# Altium schematic symbol library IC_ADI.SCHLIB: 3169 symbols (part 2 of 181) (continued)
## AD664AJ
designator U?
Quad 12-Bit Monolithic Digital-to-Analog Converter, -40 to +85 degC, J-44, Pb-Free, Tube; Generic Part Number: AD664; PartNumber: AD664AJ; # DAC Outputs: 4; Max V+: 16.5V; Op Pwr Diss: 525mW; Resolution (Bits): 12; Settling Time: 8祍; Single Supply: No; DatasheetVersion: Rev.D; PackageVersion: rev0, 1992; PackageReference: J-44; PackageDescription: 44-Pin Leaded Chip Carrier 1.27 mm Pitch; Supplier Part Number 1: AD664AJ-ND; Supplier Part Number 2: 584-AD664AJ; Packing: Tube; RoHS: Y; Mounting Technology: Surface Mount; ComponentLink1Description: Manufacturer URL; ComponentLink2Description: Datasheet; ComponentLink3Description: Package Specification; ComponentLink4Description: Product URL
footprint PLCC-44N (Footprint not found)
pins: 1 ~{RD} (in), 2 ~{LS} (in), 3 NO CONNECT, 4 AGND (power), 5 VCC (+12V/+15V) (power), 6 VEE (-12V/-15V) (power), 7 RFA (in), 8 VOA (hiz), 9 VOB (hiz), 10 RFB (in), 11 VREFIN (in), 12 RFC (in), 13 VOC (hiz), 14 VOD (hiz), 15 RFD (in), 16 NO CONNECT, 17 NO CONNECT, 18 ~{CS} (in), 19 DS0 (in), 20 DS1 (in), 21 DGND (power), 22 ~{RST} (in), 23 ~{QS0} (in), 24 ~{QS1} (in), 25 ~{QS2} (in), 26 ~{TR} (in), 27 ~{MS} (in), 28 (LSB) DB0 (io), 29 DB1 (io), 30 DB2 (io), 31 DB3 (io), 32 DB4 (io), 33 DB5 (io), 34 NO CONNECT, 35 DB6 (io), 36 DB7 (io), 37 DB8 (io), 38 DB9 (io), 39 DB10 (io), 40 DB11 (MSB) (io), 41 NO CONNECT, 42 VLL (+5V) (power), 43 NO CONNECT, 44 NO CONNECT

## AD664BD-BIP
designator U?
Quad 12-Bit Monolithic Digital-to-Analog Converter, -40 to +85 degC, D-28-2, Tube; Generic Part Number: AD664; PartNumber: AD664BD-BIP; # DAC Outputs: 4; Max V+: 16.5V; Op Pwr Diss: 525mW; Resolution (Bits): 12; Settling Time: 8祍; Single Supply: No; DatasheetVersion: Rev.D; PackageVersion: Oct-2004; PackageReference: D-28-2; PackageDescription: 28-Lead Side-Brazed Ceramic Dual In-Line Package [SBDIP]; Supplier Part Number 1: AD664BD-BIP-ND; Supplier Part Number 2: 05F7168; Supplier Part Number 3: 584-AD664BD-BIP; Packing: Tube; RoHS: N; Mounting Technology: Through Hole; ComponentLink1Description: Manufacturer URL; ComponentLink2Description: Datasheet; ComponentLink3Description: Package Specification; ComponentLink4Description: Product URL
footprint DIP28W (Footprint not found)
pins: 1 VREFIN (in), 2 VOC (hiz), 3 VOD (hiz), 4 ~{CS} (in), 5 DS0 (in), 6 DS1 (in), 7 DGND (power), 8 ~{RST} (in), 9 DB0 (LSB) (io), 10 DB1 (io), 11 DB2 (io), 12 DB3 (io), 13 DB4 (io), 14 DB5 (io), 15 DB6 (io), 16 DB7 (io), 17 DB8 (io), 18 DB9 (io), 19 DB10 (io), 20 DB11 (MSB) (io), 21 VLL (+5V) (power), 22 ~{RD} (in), 23 ~{LS} (in), 24 AGND (power), 25 VCC (+12V/+15V) (power), 26 VEE(-12V/-15V) (power), 27 VOA (hiz), 28 VOB (hiz)

## AD664BD-UNI
designator U?
Quad 12-Bit Monolithic Digital-to-Analog Converter, -40 to +85 degC, D-28-2, Tube; Generic Part Number: AD664; PartNumber: AD664BD-UNI; # DAC Outputs: 4; Max V+: 16.5V; Op Pwr Diss: 525mW; Resolution (Bits): 12; Settling Time: 8祍; Single Supply: No; DatasheetVersion: Rev.D; PackageVersion: Oct-2004; PackageReference: D-28-2; PackageDescription: 28-Lead Side-Brazed Ceramic Dual In-Line Package [SBDIP]; Supplier Part Number 1: AD664BD-UNI-ND; Supplier Part Number 2: 05F7169; Supplier Part Number 3: 584-AD664BD-UNI; Packing: Tube; RoHS: N; Mounting Technology: Through Hole; ComponentLink1Description: Manufacturer URL; ComponentLink2Description: Datasheet; ComponentLink3Description: Package Specification; ComponentLink4Description: Product URL
footprint DIP28W (Footprint not found)
pins: 1 VREFIN (in), 2 VOC (hiz), 3 VOD (hiz), 4 ~{CS} (in), 5 DS0 (in), 6 DS1 (in), 7 DGND (power), 8 ~{RST} (in), 9 DB0 (LSB) (io), 10 DB1 (io), 11 DB2 (io), 12 DB3 (io), 13 DB4 (io), 14 DB5 (io), 15 DB6 (io), 16 DB7 (io), 17 DB8 (io), 18 DB9 (io), 19 DB10 (io), 20 DB11 (MSB) (io), 21 VLL (+5V) (power), 22 ~{RD} (in), 23 ~{LS} (in), 24 AGND (power), 25 VCC (+12V/+15V) (power), 26 VEE(-12V/-15V) (power), 27 VOA (hiz), 28 VOB (hiz)

## AD664BE
designator U?
Quad 12-Bit Monolithic Digital-to-Analog Converter, -40 to +85 degC, E-44-1, Pb-Free, Tube; Generic Part Number: AD664; PartNumber: AD664BE; # DAC Outputs: 4; Max V+: 16.5V; Op Pwr Diss: 525mW; Resolution (Bits): 12; Settling Time: 8祍; Single Supply: No; DatasheetVersion: Rev.D; PackageVersion: 022106-A; PackageReference: E-44-1; PackageDescription: 44-Terminal Ceramic Leadless Chip Carrier [LCC]; Supplier Part Number 1: AD664BE-ND; Supplier Part Number 2: 584-AD664BE; Packing: Tube; RoHS: Y; Mounting Technology: Surface Mount; ComponentLink1Description: Manufacturer URL; ComponentLink2Description: Datasheet; ComponentLink3Description: Package Specification; ComponentLink4Description: Product URL
footprint PLCC-44N (Footprint not found)
pins: 1 ~{RD} (in), 2 ~{LS} (in), 3 NO CONNECT, 4 AGND (power), 5 VCC (+12V/+15V) (power), 6 VEE (-12V/-15V) (power), 7 RFA (in), 8 VOA (hiz), 9 VOB (hiz), 10 RFB (in), 11 VREFIN (in), 12 RFC (in), 13 VOC (hiz), 14 VOD (hiz), 15 RFD (in), 16 NO CONNECT, 17 NO CONNECT, 18 ~{CS} (in), 19 DS0 (in), 20 DS1 (in), 21 DGND (power), 22 ~{RST} (in), 23 ~{QS0} (in), 24 ~{QS1} (in), 25 ~{QS2} (in), 26 ~{TR} (in), 27 ~{MS} (in), 28 (LSB) DB0 (io), 29 DB1 (io), 30 DB2 (io), 31 DB3 (io), 32 DB4 (io), 33 DB5 (io), 34 NO CONNECT, 35 DB6 (io), 36 DB7 (io), 37 DB8 (io), 38 DB9 (io), 39 DB10 (io), 40 DB11 (MSB) (io), 41 NO CONNECT, 42 VLL (+5V) (power), 43 NO CONNECT, 44 NO CONNECT

## AD664BJ
designator U?
Quad 12-Bit Monolithic Digital-to-Analog Converter, -40 to +85 degC, J-44, Pb-Free, Tube; Generic Part Number: AD664; PartNumber: AD664BJ; # DAC Outputs: 4; Max V+: 16.5V; Op Pwr Diss: 525mW; Resolution (Bits): 12; Settling Time: 8祍; Single Supply: No; DatasheetVersion: Rev.D; PackageVersion: rev0, 1992; PackageReference: J-44; PackageDescription: 44-Pin Leaded Chip Carrier 1.27 mm Pitch; Supplier Part Number 1: AD664BJ-ND; Packing: Tube; RoHS: Y; Mounting Technology: Surface Mount; ComponentLink1Description: Manufacturer URL; ComponentLink2Description: Datasheet; ComponentLink3Description: Package Specification; ComponentLink4Description: Product URL
footprint PLCC-44N (Footprint not found)
pins: 1 ~{RD} (in), 2 ~{LS} (in), 3 NO CONNECT, 4 AGND (power), 5 VCC (+12V/+15V) (power), 6 VEE (-12V/-15V) (power), 7 RFA (in), 8 VOA (hiz), 9 VOB (hiz), 10 RFB (in), 11 VREFIN (in), 12 RFC (in), 13 VOC (hiz), 14 VOD (hiz), 15 RFD (in), 16 NO CONNECT, 17 NO CONNECT, 18 ~{CS} (in), 19 DS0 (in), 20 DS1 (in), 21 DGND (power), 22 ~{RST} (in), 23 ~{QS0} (in), 24 ~{QS1} (in), 25 ~{QS2} (in), 26 ~{TR} (in), 27 ~{MS} (in), 28 (LSB) DB0 (io), 29 DB1 (io), 30 DB2 (io), 31 DB3 (io), 32 DB4 (io), 33 DB5 (io), 34 NO CONNECT, 35 DB6 (io), 36 DB7 (io), 37 DB8 (io), 38 DB9 (io), 39 DB10 (io), 40 DB11 (MSB) (io), 41 NO CONNECT, 42 VLL (+5V) (power), 43 NO CONNECT, 44 NO CONNECT

## AD664JN-BIP
designator U?
Quad 12-Bit Monolithic Digital-to-Analog Converter, 0 to +70 degC, N-28-2, Tube; Generic Part Number: AD664; PartNumber: AD664JN-BIP; # DAC Outputs: 4; Max V+: 16.5V; Op Pwr Diss: 525mW; Resolution (Bits): 12; Settling Time: 8祍; Single Supply: No; DatasheetVersion: Rev.D; PackageVersion: 071006-A; PackageReference: N-28-2; PackageDescription: 28-Lead Plastic Dual In-Line Package [PDIP]; Supplier Part Number 1: AD664JN-BIP-ND; Supplier Part Number 2: 92F8921; Supplier Part Number 3: 584-AD664JN-BIP; Packing: Tube; RoHS: N; Mounting Technology: Through Hole; Code_JEDEC: MS-011; ComponentLink1Description: Manufacturer URL; ComponentLink2Description: Datasheet; ComponentLink3Description: Package Specification; ComponentLink4Description: Product URL
footprint DIP28W
pins: 1 VREF IN (in), 2 VOC (hiz), 3 VOD (hiz), 4 ~{CS} (in), 5 DS0 (in), 6 DS1 (in), 7 DGND (power), 8 ~{RST} (in), 9 DB0 (LSB) (io), 10 DB1 (io), 11 DB2 (io), 12 DB3 (io), 13 DB4 (io), 14 DB5 (io), 15 DB6 (io), 16 DB7 (io), 17 DB8 (io), 18 DB9 (io), 19 DB10 (io), 20 DB11 (MSB) (io), 21 VLL (+5V) (power), 22 ~{RD} (in), 23 ~{LS} (in), 24 AGND (power), 25 VCC (+12V/+15V) (power), 26 VEE (-12V/-15V) (power), 27 VOA (hiz), 28 VOB (hiz)

## AD664JN-UNI
designator U?
Quad 12-Bit Monolithic Digital-to-Analog Converter, 0 to +70 degC, N-28-2, Tube; Generic Part Number: AD664; PartNumber: AD664JN-UNI; # DAC Outputs: 4; Max V+: 16.5V; Op Pwr Diss: 525mW; Resolution (Bits): 12; Settling Time: 8祍; Single Supply: No; DatasheetVersion: Rev.D; PackageVersion: 071006-A; PackageReference: N-28-2; PackageDescription: 28-Lead Plastic Dual In-Line Package [PDIP]; Supplier Part Number 1: AD664JN-UNI-ND; Supplier Part Number 2: 92F8924; Supplier Part Number 3: 584-AD664JN-UNI; Packing: Tube; RoHS: N; Mounting Technology: Through Hole; Code_JEDEC: MS-011; ComponentLink1Description: Manufacturer URL; ComponentLink2Description: Datasheet; ComponentLink3Description: Package Specification; ComponentLink4Description: Product URL
footprint DIP28W
pins: 1 VREF IN (in), 2 VOC (hiz), 3 VOD (hiz), 4 ~{CS} (in), 5 DS0 (in), 6 DS1 (in), 7 DGND (power), 8 ~{RST} (in), 9 DB0 (LSB) (io), 10 DB1 (io), 11 DB2 (io), 12 DB3 (io), 13 DB4 (io), 14 DB5 (io), 15 DB6 (io), 16 DB7 (io), 17 DB8 (io), 18 DB9 (io), 19 DB10 (io), 20 DB11 (MSB) (io), 21 VLL (+5V) (power), 22 ~{RD} (in), 23 ~{LS} (in), 24 AGND (power), 25 VCC (+12V/+15V) (power), 26 VEE (-12V/-15V) (power), 27 VOA (hiz), 28 VOB (hiz)

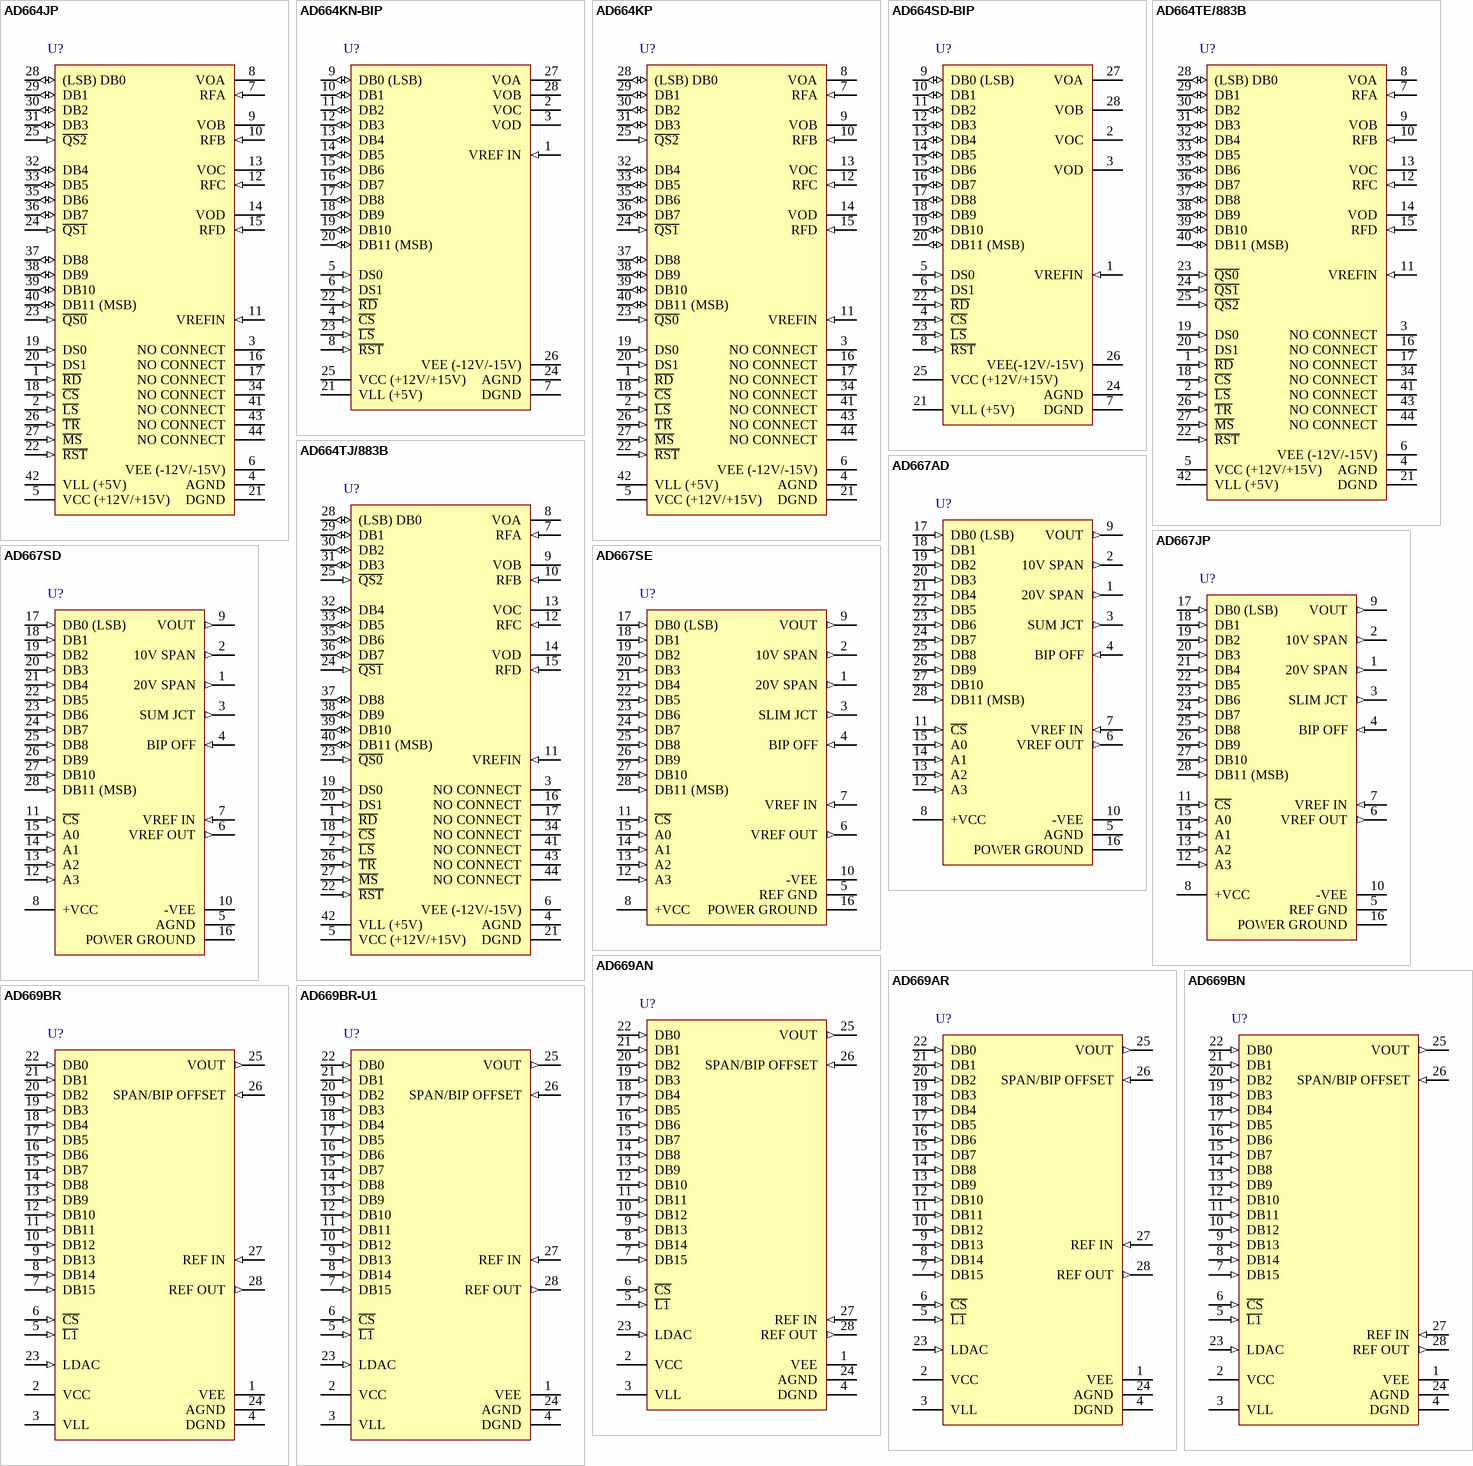
[diagram p3: symbols AD664JP to AD669BR-U1]

## AD664JP
designator U?
Quad 12-Bit Monolithic Digital-to-Analog Converter, 0 to +70 degC, P-44A, Tube; Generic Part Number: AD664; PartNumber: AD664JP; # DAC Outputs: 4; Max V+: 16.5V; Op Pwr Diss: 525mW; Resolution (Bits): 12; Settling Time: 8祍; Single Supply: No; DatasheetVersion: Rev.D; PackageVersion: 2003; PackageReference: P-44A; PackageDescription: 44-Lead Plastic Leaded Chip Carrier [PLCC]; Supplier Part Number 1: AD664JP-ND; Supplier Part Number 2: 584-AD664JP; Packing: Tube; RoHS: N; Mounting Technology: Surface Mount; Code_JEDEC: MO-047-AC; Code_IPC: PLCC-44; ComponentLink1Description: Manufacturer URL; ComponentLink2Description: Datasheet; ComponentLink3Description: Package Specification; ComponentLink4Description: Product URL
footprint PLCC-44N (Footprint not found)
pins: 1 ~{RD} (in), 2 ~{LS} (in), 3 NO CONNECT, 4 AGND (power), 5 VCC (+12V/+15V) (power), 6 VEE (-12V/-15V) (power), 7 RFA (in), 8 VOA (hiz), 9 VOB (hiz), 10 RFB (in), 11 VREFIN (in), 12 RFC (in), 13 VOC (hiz), 14 VOD (hiz), 15 RFD (in), 16 NO CONNECT, 17 NO CONNECT, 18 ~{CS} (in), 19 DS0 (in), 20 DS1 (in), 21 DGND (power), 22 ~{RST} (in), 23 ~{QS0} (in), 24 ~{QS1} (in), 25 ~{QS2} (in), 26 ~{TR} (in), 27 ~{MS} (in), 28 (LSB) DB0 (io), 29 DB1 (io), 30 DB2 (io), 31 DB3 (io), 32 DB4 (io), 33 DB5 (io), 34 NO CONNECT, 35 DB6 (io), 36 DB7 (io), 37 DB8 (io), 38 DB9 (io), 39 DB10 (io), 40 DB11 (MSB) (io), 41 NO CONNECT, 42 VLL (+5V) (power), 43 NO CONNECT, 44 NO CONNECT

## AD664KN-BIP
designator U?
Quad 12-Bit Monolithic Digital-to-Analog Converter, 0 to +70 degC, N-28-2, Tube; Generic Part Number: AD664; PartNumber: AD664KN-BIP; # DAC Outputs: 4; Max V+: 16.5V; Op Pwr Diss: 525mW; Resolution (Bits): 12; Settling Time: 8祍; Single Supply: No; DatasheetVersion: Rev.D; PackageVersion: 071006-A; PackageReference: N-28-2; PackageDescription: 28-Lead Plastic Dual In-Line Package [PDIP]; Supplier Part Number 1: AD664KN-BIP-ND; Supplier Part Number 2: 92F8922; Supplier Part Number 3: 584-AD664KN-BIP; Packing: Tube; RoHS: N; Mounting Technology: Through Hole; Code_JEDEC: MS-011; ComponentLink1Description: Manufacturer URL; ComponentLink2Description: Datasheet; ComponentLink3Description: Package Specification; ComponentLink4Description: Product URL
footprint DIP28W
pins: 1 VREF IN (in), 2 VOC (hiz), 3 VOD (hiz), 4 ~{CS} (in), 5 DS0 (in), 6 DS1 (in), 7 DGND (power), 8 ~{RST} (in), 9 DB0 (LSB) (io), 10 DB1 (io), 11 DB2 (io), 12 DB3 (io), 13 DB4 (io), 14 DB5 (io), 15 DB6 (io), 16 DB7 (io), 17 DB8 (io), 18 DB9 (io), 19 DB10 (io), 20 DB11 (MSB) (io), 21 VLL (+5V) (power), 22 ~{RD} (in), 23 ~{LS} (in), 24 AGND (power), 25 VCC (+12V/+15V) (power), 26 VEE (-12V/-15V) (power), 27 VOA (hiz), 28 VOB (hiz)

## AD664KP
designator U?
Quad 12-Bit Monolithic Digital-to-Analog Converter, 0 to +70 degC, P-44A, Tube; Generic Part Number: AD664; PartNumber: AD664KP; # DAC Outputs: 4; Max V+: 16.5V; Op Pwr Diss: 525mW; Resolution (Bits): 12; Settling Time: 8祍; Single Supply: No; DatasheetVersion: Rev.D; PackageVersion: 2003; PackageReference: P-44A; PackageDescription: 44-Lead Plastic Leaded Chip Carrier [PLCC]; Supplier Part Number 1: AD664KP-ND; Supplier Part Number 2: 05F7173; Supplier Part Number 3: 584-AD664KP; Packing: Tube; RoHS: N; Mounting Technology: Surface Mount; Code_JEDEC: MO-047-AC; Code_IPC: PLCC-44; ComponentLink1Description: Manufacturer URL; ComponentLink2Description: Datasheet; ComponentLink3Description: Package Specification; ComponentLink4Description: Product URL
footprint PLCC-44N (Footprint not found)
pins: 1 ~{RD} (in), 2 ~{LS} (in), 3 NO CONNECT, 4 AGND (power), 5 VCC (+12V/+15V) (power), 6 VEE (-12V/-15V) (power), 7 RFA (in), 8 VOA (hiz), 9 VOB (hiz), 10 RFB (in), 11 VREFIN (in), 12 RFC (in), 13 VOC (hiz), 14 VOD (hiz), 15 RFD (in), 16 NO CONNECT, 17 NO CONNECT, 18 ~{CS} (in), 19 DS0 (in), 20 DS1 (in), 21 DGND (power), 22 ~{RST} (in), 23 ~{QS0} (in), 24 ~{QS1} (in), 25 ~{QS2} (in), 26 ~{TR} (in), 27 ~{MS} (in), 28 (LSB) DB0 (io), 29 DB1 (io), 30 DB2 (io), 31 DB3 (io), 32 DB4 (io), 33 DB5 (io), 34 NO CONNECT, 35 DB6 (io), 36 DB7 (io), 37 DB8 (io), 38 DB9 (io), 39 DB10 (io), 40 DB11 (MSB) (io), 41 NO CONNECT, 42 VLL (+5V) (power), 43 NO CONNECT, 44 NO CONNECT

## AD664SD-BIP
designator U?
Quad 12-Bit Monolithic Digital-to-Analog Converter, -55 to +125 degC, D-28-2, Tube; Generic Part Number: AD664; PartNumber: AD664SD-BIP; # DAC Outputs: 4; Max V+: 16.5V; Op Pwr Diss: 525mW; Resolution (Bits): 12; Settling Time: 8祍; Single Supply: No; DatasheetVersion: Rev.D; PackageVersion: Oct-2004; PackageReference: D-28-2; PackageDescription: 28-Lead Side-Brazed Ceramic Dual In-Line Package [SBDIP]; Supplier Part Number 1: AD664SD-BIP-ND; Supplier Part Number 2: 16F3498; Supplier Part Number 3: 584-AD664SD-BIP; Packing: Tube; RoHS: N; Mounting Technology: Through Hole; ComponentLink1Description: Manufacturer URL; ComponentLink2Description: Datasheet; ComponentLink3Description: Package Specification; ComponentLink4Description: Product URL
footprint DIP28W (Footprint not found)
pins: 1 VREFIN (in), 2 VOC (hiz), 3 VOD (hiz), 4 ~{CS} (in), 5 DS0 (in), 6 DS1 (in), 7 DGND (power), 8 ~{RST} (in), 9 DB0 (LSB) (io), 10 DB1 (io), 11 DB2 (io), 12 DB3 (io), 13 DB4 (io), 14 DB5 (io), 15 DB6 (io), 16 DB7 (io), 17 DB8 (io), 18 DB9 (io), 19 DB10 (io), 20 DB11 (MSB) (io), 21 VLL (+5V) (power), 22 ~{RD} (in), 23 ~{LS} (in), 24 AGND (power), 25 VCC (+12V/+15V) (power), 26 VEE(-12V/-15V) (power), 27 VOA (hiz), 28 VOB (hiz)

## AD664TE/883B
designator U?
Quad 12-Bit Monolithic Digital-to-Analog Converter, -55 to +125 degC, E-44-1, Tube; Generic Part Number: AD664; PartNumber: AD664TE/883B; # DAC Outputs: 4; Max V+: 16.5V; Op Pwr Diss: 525mW; Resolution (Bits): 12; Settling Time: 8祍; Single Supply: No; DatasheetVersion: Rev.D; PackageVersion: 022106-A; PackageReference: E-44-1; PackageDescription: 44-Terminal Ceramic Leadless Chip Carrier [LCC]; Supplier Part Number 1: 584-AD664TE883B; Packing: Tube; RoHS: N; Mounting Technology: Surface Mount; ComponentLink1Description: Manufacturer URL; ComponentLink2Description: Datasheet; ComponentLink3Description: Package Specification; ComponentLink4Description: Product URL
footprint PLCC-44N (Footprint not found)
pins: 1 ~{RD} (in), 2 ~{LS} (in), 3 NO CONNECT, 4 AGND (power), 5 VCC (+12V/+15V) (power), 6 VEE (-12V/-15V) (power), 7 RFA (in), 8 VOA (hiz), 9 VOB (hiz), 10 RFB (in), 11 VREFIN (in), 12 RFC (in), 13 VOC (hiz), 14 VOD (hiz), 15 RFD (in), 16 NO CONNECT, 17 NO CONNECT, 18 ~{CS} (in), 19 DS0 (in), 20 DS1 (in), 21 DGND (power), 22 ~{RST} (in), 23 ~{QS0} (in), 24 ~{QS1} (in), 25 ~{QS2} (in), 26 ~{TR} (in), 27 ~{MS} (in), 28 (LSB) DB0 (io), 29 DB1 (io), 30 DB2 (io), 31 DB3 (io), 32 DB4 (io), 33 DB5 (io), 34 NO CONNECT, 35 DB6 (io), 36 DB7 (io), 37 DB8 (io), 38 DB9 (io), 39 DB10 (io), 40 DB11 (MSB) (io), 41 NO CONNECT, 42 VLL (+5V) (power), 43 NO CONNECT, 44 NO CONNECT

## AD664TJ/883B
designator U?
Quad 12-Bit Monolithic Digital-to-Analog Converter, -55 to +125 degC, J-44, Tube; Generic Part Number: AD664; PartNumber: AD664TJ/883B; # DAC Outputs: 4; Max V+: 16.5V; Op Pwr Diss: 525mW; Resolution (Bits): 12; Settling Time: 8祍; Single Supply: No; DatasheetVersion: Rev.D; PackageVersion: rev0, 1992; PackageReference: J-44; PackageDescription: 44-Pin Leaded Chip Carrier 1.27 mm Pitch; Supplier Part Number 1: 584-AD664TJ883B; Packing: Tube; RoHS: N; Mounting Technology: Surface Mount; ComponentLink1Description: Manufacturer URL; ComponentLink2Description: Datasheet; ComponentLink3Description: Package Specification; ComponentLink4Description: Product URL
footprint PLCC-44N (Footprint not found)
pins: 1 ~{RD} (in), 2 ~{LS} (in), 3 NO CONNECT, 4 AGND (power), 5 VCC (+12V/+15V) (power), 6 VEE (-12V/-15V) (power), 7 RFA (in), 8 VOA (hiz), 9 VOB (hiz), 10 RFB (in), 11 VREFIN (in), 12 RFC (in), 13 VOC (hiz), 14 VOD (hiz), 15 RFD (in), 16 NO CONNECT, 17 NO CONNECT, 18 ~{CS} (in), 19 DS0 (in), 20 DS1 (in), 21 DGND (power), 22 ~{RST} (in), 23 ~{QS0} (in), 24 ~{QS1} (in), 25 ~{QS2} (in), 26 ~{TR} (in), 27 ~{MS} (in), 28 (LSB) DB0 (io), 29 DB1 (io), 30 DB2 (io), 31 DB3 (io), 32 DB4 (io), 33 DB5 (io), 34 NO CONNECT, 35 DB6 (io), 36 DB7 (io), 37 DB8 (io), 38 DB9 (io), 39 DB10 (io), 40 DB11 (MSB) (io), 41 NO CONNECT, 42 VLL (+5V) (power), 43 NO CONNECT, 44 NO CONNECT

## AD667AD
designator U?
Single 12-Bit Microprocessor-Compatible Digital-to-Analog Converter, 25 to +85 degC, D-28-2, Tube; Generic Part Number: AD667; PartNumber: AD667AD; # DAC Outputs: 1; Max V+: 16.5V; Op Pwr Diss: 555mW; Resolution (Bits): 12; Settling Time: 2祍; Single Supply: No; DatasheetVersion: Rev.A; PackageVersion: Oct-2004; PackageReference: D-28-2; PackageDescription: 28-Lead Side-Brazed Ceramic Dual In-Line Package [SBDIP]; Supplier Part Number 1: AD667AD-ND; Supplier Part Number 2: 05F7174; Supplier Part Number 3: 584-AD667AD; Packing: Tube; RoHS: N; Mounting Technology: Through Hole; ComponentLink1Description: Manufacturer URL; ComponentLink2Description: Datasheet; ComponentLink3Description: Package Specification; ComponentLink4Description: Product URL
footprint DIP28W (Footprint not found)
pins: 1 20V SPAN (out), 2 10V SPAN (out), 3 SUM JCT (out), 4 BIP OFF (in), 5 AGND (power), 6 VREF OUT (out), 7 VREF IN (in), 8 +VCC (power), 9 VOUT (out), 10 -VEE (power), 11 ~{CS} (in), 12 A3 (in), 13 A2 (in), 14 A1 (in), 15 A0 (in), 16 POWER GROUND (power), 17 DB0 (LSB) (in), 18 DB1 (in), 19 DB2 (in), 20 DB3 (in), 21 DB4 (in), 22 DB5 (in), 23 DB6 (in), 24 DB7 (in), 25 DB8 (in), 26 DB9 (in), 27 DB10 (in), 28 DB11 (MSB) (in)

## AD667JP
designator U?
Single 12-Bit Microprocessor-Compatible Digital-to-Analog Converter, 0 to +70 degC, P-28, Tube; Generic Part Number: AD667; PartNumber: AD667JP; # DAC Outputs: 1; Max V+: 16.5V; Op Pwr Diss: 555mW; Resolution (Bits): 12; Settling Time: 2祍; Single Supply: No; DatasheetVersion: Rev.A; PackageVersion: 042508-A; PackageReference: P-28; PackageDescription: 28-Lead Plastic Leaded Chip Carrier [PLCC]; Supplier Part Number 1: AD667JP-ND; Supplier Part Number 2: 584-AD667JP; Packing: Tube; RoHS: N; Mounting Technology: Surface Mount; Code_JEDEC: MO-047-AB; ComponentLink1Description: Manufacturer URL; ComponentLink2Description: Datasheet; ComponentLink3Description: Package Specification; ComponentLink4Description: Product URL
footprint PLCC-28N (Footprint not found)
pins: 1 20V SPAN (out), 2 10V SPAN (out), 3 SLIM JCT (out), 4 BIP OFF (in), 5 REF GND (power), 6 VREF OUT (out), 7 VREF IN (in), 8 +VCC (power), 9 VOUT (out), 10 -VEE (power), 11 ~{CS} (in), 12 A3 (in), 13 A2 (in), 14 A1 (in), 15 A0 (in), 16 POWER GROUND (power), 17 DB0 (LSB) (in), 18 DB1 (in), 19 DB2 (in), 20 DB3 (in), 21 DB4 (in), 22 DB5 (in), 23 DB6 (in), 24 DB7 (in), 25 DB8 (in), 26 DB9 (in), 27 DB10 (in), 28 DB11 (MSB) (in)

## AD667SD
designator U?
Single 12-Bit Microprocessor-Compatible Digital-to-Analog Converter, -55 to +125 degC, D-28-2, Tube; Generic Part Number: AD667; PartNumber: AD667SD; # DAC Outputs: 1; Max V+: 16.5V; Op Pwr Diss: 555mW; Resolution (Bits): 12; Settling Time: 2祍; Single Supply: No; DatasheetVersion: Rev.A; PackageVersion: Oct-2004; PackageReference: D-28-2; PackageDescription: 28-Lead Side-Brazed Ceramic Dual In-Line Package [SBDIP]; Supplier Part Number 1: AD667SD-ND; Supplier Part Number 2: 66F5809; Supplier Part Number 3: 584-AD667SD; Packing: Tube; RoHS: N; Mounting Technology: Through Hole; ComponentLink1Description: Manufacturer URL; ComponentLink2Description: Datasheet; ComponentLink3Description: Package Specification; ComponentLink4Description: Product URL
footprint DIP28W (Footprint not found)
pins: 1 20V SPAN (out), 2 10V SPAN (out), 3 SUM JCT (out), 4 BIP OFF (in), 5 AGND (power), 6 VREF OUT (out), 7 VREF IN (in), 8 +VCC (power), 9 VOUT (out), 10 -VEE (power), 11 ~{CS} (in), 12 A3 (in), 13 A2 (in), 14 A1 (in), 15 A0 (in), 16 POWER GROUND (power), 17 DB0 (LSB) (in), 18 DB1 (in), 19 DB2 (in), 20 DB3 (in), 21 DB4 (in), 22 DB5 (in), 23 DB6 (in), 24 DB7 (in), 25 DB8 (in), 26 DB9 (in), 27 DB10 (in), 28 DB11 (MSB) (in)

## AD667SE
designator U?
Single 12-Bit Microprocessor-Compatible Digital-to-Analog Converter, -55 to +125 degC, E-28-1, Pb-Free, Tube; Generic Part Number: AD667; PartNumber: AD667SE; # DAC Outputs: 1; Max V+: 16.5V; Op Pwr Diss: 555mW; Resolution (Bits): 12; Settling Time: 2祍; Single Supply: No; DatasheetVersion: Rev.A; PackageVersion: 022106-A; PackageReference: E-28-1; PackageDescription: 28-Terminal Ceramic Leadless Chip Carrier [LCC]; Supplier Part Number 1: AD667SE-ND; Supplier Part Number 2: 16F3497; Supplier Part Number 3: 584-AD667SE; Packing: Tube; RoHS: Y; Mounting Technology: Surface Mount; ComponentLink1Description: Manufacturer URL; ComponentLink2Description: Datasheet; ComponentLink3Description: Package Specification; ComponentLink4Description: Product URL
footprint PLCC-28N (Footprint not found)
pins: 1 20V SPAN (out), 2 10V SPAN (out), 3 SLIM JCT (out), 4 BIP OFF (in), 5 REF GND (power), 6 VREF OUT (out), 7 VREF IN (in), 8 +VCC (power), 9 VOUT (out), 10 -VEE (power), 11 ~{CS} (in), 12 A3 (in), 13 A2 (in), 14 A1 (in), 15 A0 (in), 16 POWER GROUND (power), 17 DB0 (LSB) (in), 18 DB1 (in), 19 DB2 (in), 20 DB3 (in), 21 DB4 (in), 22 DB5 (in), 23 DB6 (in), 24 DB7 (in), 25 DB8 (in), 26 DB9 (in), 27 DB10 (in), 28 DB11 (MSB) (in)

## AD669AN
designator U?
Single 16-Bit Monolithic DACPORT, -40 to +85 degC, N-28-2, Tube; Generic Part Number: AD669; PartNumber: AD669AN; # DAC Outputs: 1; Max V+: 16.5V; Op Pwr Diss: 625mW; Resolution (Bits): 16; Settling Time: 6祍; Single Supply: No; DatasheetVersion: Rev.A; PackageVersion: 071006-A; PackageReference: N-28-2; PackageDescription: 28-Lead Plastic Dual In-Line Package [PDIP]; Supplier Part Number 1: AD669AN-ND; Supplier Part Number 2: 584-AD669AN; Packing: Tube; RoHS: N; Mounting Technology: Through Hole; Code_JEDEC: MS-011; ComponentLink1Description: Manufacturer URL; ComponentLink2Description: Datasheet; ComponentLink3Description: Package Specification; ComponentLink4Description: Product URL
footprint DIP28W
pins: 1 VEE (power), 2 VCC (power), 3 VLL (power), 4 DGND (power), 5 ~{L1} (in), 6 ~{CS} (in), 7 DB15 (in), 8 DB14 (in), 9 DB13 (in), 10 DB12 (in), 11 DB11 (in), 12 DB10 (in), 13 DB9 (in), 14 DB8 (in), 15 DB7 (in), 16 DB6 (in), 17 DB5 (in), 18 DB4 (in), 19 DB3 (in), 20 DB2 (in), 21 DB1 (in), 22 DB0 (in), 23 LDAC (in), 24 AGND (power), 25 VOUT (out), 26 SPAN/BIP OFFSET (in), 27 REF IN (in), 28 REF OUT (out)

## AD669AR
designator U?
Single 16-Bit Monolithic DACPORT, -40 to +85 degC, RW-28, Tube; Generic Part Number: AD669; PartNumber: AD669AR; # DAC Outputs: 1; Max V+: 16.5V; Op Pwr Diss: 625mW; Resolution (Bits): 16; Settling Time: 6祍; Single Supply: No; DatasheetVersion: Rev.A; PackageVersion: 060706-A; PackageReference: RW-28; PackageDescription: 28-Lead Standard Small Outline Package [SOIC_W]; Supplier Part Number 1: AD669AR-ND; Supplier Part Number 2: 584-AD669AR; Packing: Tube; RoHS: N; Mounting Technology: Surface Mount; Code_JEDEC: MS-013-AE; ComponentLink1Description: Manufacturer URL; ComponentLink2Description: Datasheet; ComponentLink3Description: Product URL
footprint SOIC28W_1.27 (Footprint not found)
pins: 1 VEE (power), 2 VCC (power), 3 VLL (power), 4 DGND (power), 5 ~{L1} (in), 6 ~{CS} (in), 7 DB15 (in), 8 DB14 (in), 9 DB13 (in), 10 DB12 (in), 11 DB11 (in), 12 DB10 (in), 13 DB9 (in), 14 DB8 (in), 15 DB7 (in), 16 DB6 (in), 17 DB5 (in), 18 DB4 (in), 19 DB3 (in), 20 DB2 (in), 21 DB1 (in), 22 DB0 (in), 23 LDAC (in), 24 AGND (power), 25 VOUT (out), 26 SPAN/BIP OFFSET (in), 27 REF IN (in), 28 REF OUT (out)

## AD669BN
designator U?
Single 16-Bit Monolithic DACPORT, -40 to +85 degC, N-28-2, Tube; Generic Part Number: AD669; PartNumber: AD669BN; # DAC Outputs: 1; Max V+: 16.5V; Op Pwr Diss: 625mW; Resolution (Bits): 16; Settling Time: 6祍; Single Supply: No; DatasheetVersion: Rev.A; PackageVersion: 071006-A; PackageReference: N-28-2; PackageDescription: 28-Lead Plastic Dual In-Line Package [PDIP]; Supplier Part Number 1: AD669BN-ND; Supplier Part Number 2: 584-AD669BN; Packing: Tube; RoHS: N; Mounting Technology: Through Hole; Code_JEDEC: MS-011; ComponentLink1Description: Manufacturer URL; ComponentLink2Description: Datasheet; ComponentLink3Description: Package Specification; ComponentLink4Description: Product URL
footprint DIP28W
pins: 1 VEE (power), 2 VCC (power), 3 VLL (power), 4 DGND (power), 5 ~{L1} (in), 6 ~{CS} (in), 7 DB15 (in), 8 DB14 (in), 9 DB13 (in), 10 DB12 (in), 11 DB11 (in), 12 DB10 (in), 13 DB9 (in), 14 DB8 (in), 15 DB7 (in), 16 DB6 (in), 17 DB5 (in), 18 DB4 (in), 19 DB3 (in), 20 DB2 (in), 21 DB1 (in), 22 DB0 (in), 23 LDAC (in), 24 AGND (power), 25 VOUT (out), 26 SPAN/BIP OFFSET (in), 27 REF IN (in), 28 REF OUT (out)

## AD669BR
designator U?
Single 16-Bit Monolithic DACPORT, -40 to +85 degC, RW-28, Tube; Generic Part Number: AD669; PartNumber: AD669BR; # DAC Outputs: 1; Max V+: 16.5V; Op Pwr Diss: 625mW; Resolution (Bits): 16; Settling Time: 6祍; Single Supply: No; DatasheetVersion: Rev.A; PackageVersion: 060706-A; PackageReference: RW-28; PackageDescription: 28-Lead Standard Small Outline Package [SOIC_W]; Supplier Part Number 1: AD669BR-ND; Supplier Part Number 2: 28M8981; Supplier Part Number 3: 584-AD669BR; Packing: Tube; RoHS: N; Mounting Technology: Surface Mount; Code_JEDEC: MS-013-AE; ComponentLink1Description: Manufacturer URL; ComponentLink2Description: Datasheet; ComponentLink3Description: Product URL
footprint SOIC28W_1.27 (Footprint not found)
pins: 1 VEE (power), 2 VCC (power), 3 VLL (power), 4 DGND (power), 5 ~{L1} (in), 6 ~{CS} (in), 7 DB15 (in), 8 DB14 (in), 9 DB13 (in), 10 DB12 (in), 11 DB11 (in), 12 DB10 (in), 13 DB9 (in), 14 DB8 (in), 15 DB7 (in), 16 DB6 (in), 17 DB5 (in), 18 DB4 (in), 19 DB3 (in), 20 DB2 (in), 21 DB1 (in), 22 DB0 (in), 23 LDAC (in), 24 AGND (power), 25 VOUT (out), 26 SPAN/BIP OFFSET (in), 27 REF IN (in), 28 REF OUT (out)

## AD669BR-U1
designator U?
Single 16-Bit Monolithic DACPORT, -40 to +85 degC, RW-28, Tube; Generic Part Number: AD669; PartNumber: AD669BR-U1; # DAC Outputs: 1; Max V+: 16.5V; Op Pwr Diss: 625mW; Resolution (Bits): 16; Settling Time: 6祍; Single Supply: No; DatasheetVersion: Rev.A; PackageVersion: 060706-A; PackageReference: RW-28; PackageDescription: 28-Lead Standard Small Outline Package [SOIC_W]; Supplier Part Number 1: N/A; Packing: Tube; RoHS: N; Mounting Technology: Surface Mount; Code_JEDEC: MS-013-AE; ComponentLink1Description: Manufacturer URL; ComponentLink2Description: Datasheet; ComponentLink3Description: Product URL
footprint SOIC28W_1.27 (Footprint not found)
pins: 1 VEE (power), 2 VCC (power), 3 VLL (power), 4 DGND (power), 5 ~{L1} (in), 6 ~{CS} (in), 7 DB15 (in), 8 DB14 (in), 9 DB13 (in), 10 DB12 (in), 11 DB11 (in), 12 DB10 (in), 13 DB9 (in), 14 DB8 (in), 15 DB7 (in), 16 DB6 (in), 17 DB5 (in), 18 DB4 (in), 19 DB3 (in), 20 DB2 (in), 21 DB1 (in), 22 DB0 (in), 23 LDAC (in), 24 AGND (power), 25 VOUT (out), 26 SPAN/BIP OFFSET (in), 27 REF IN (in), 28 REF OUT (out)

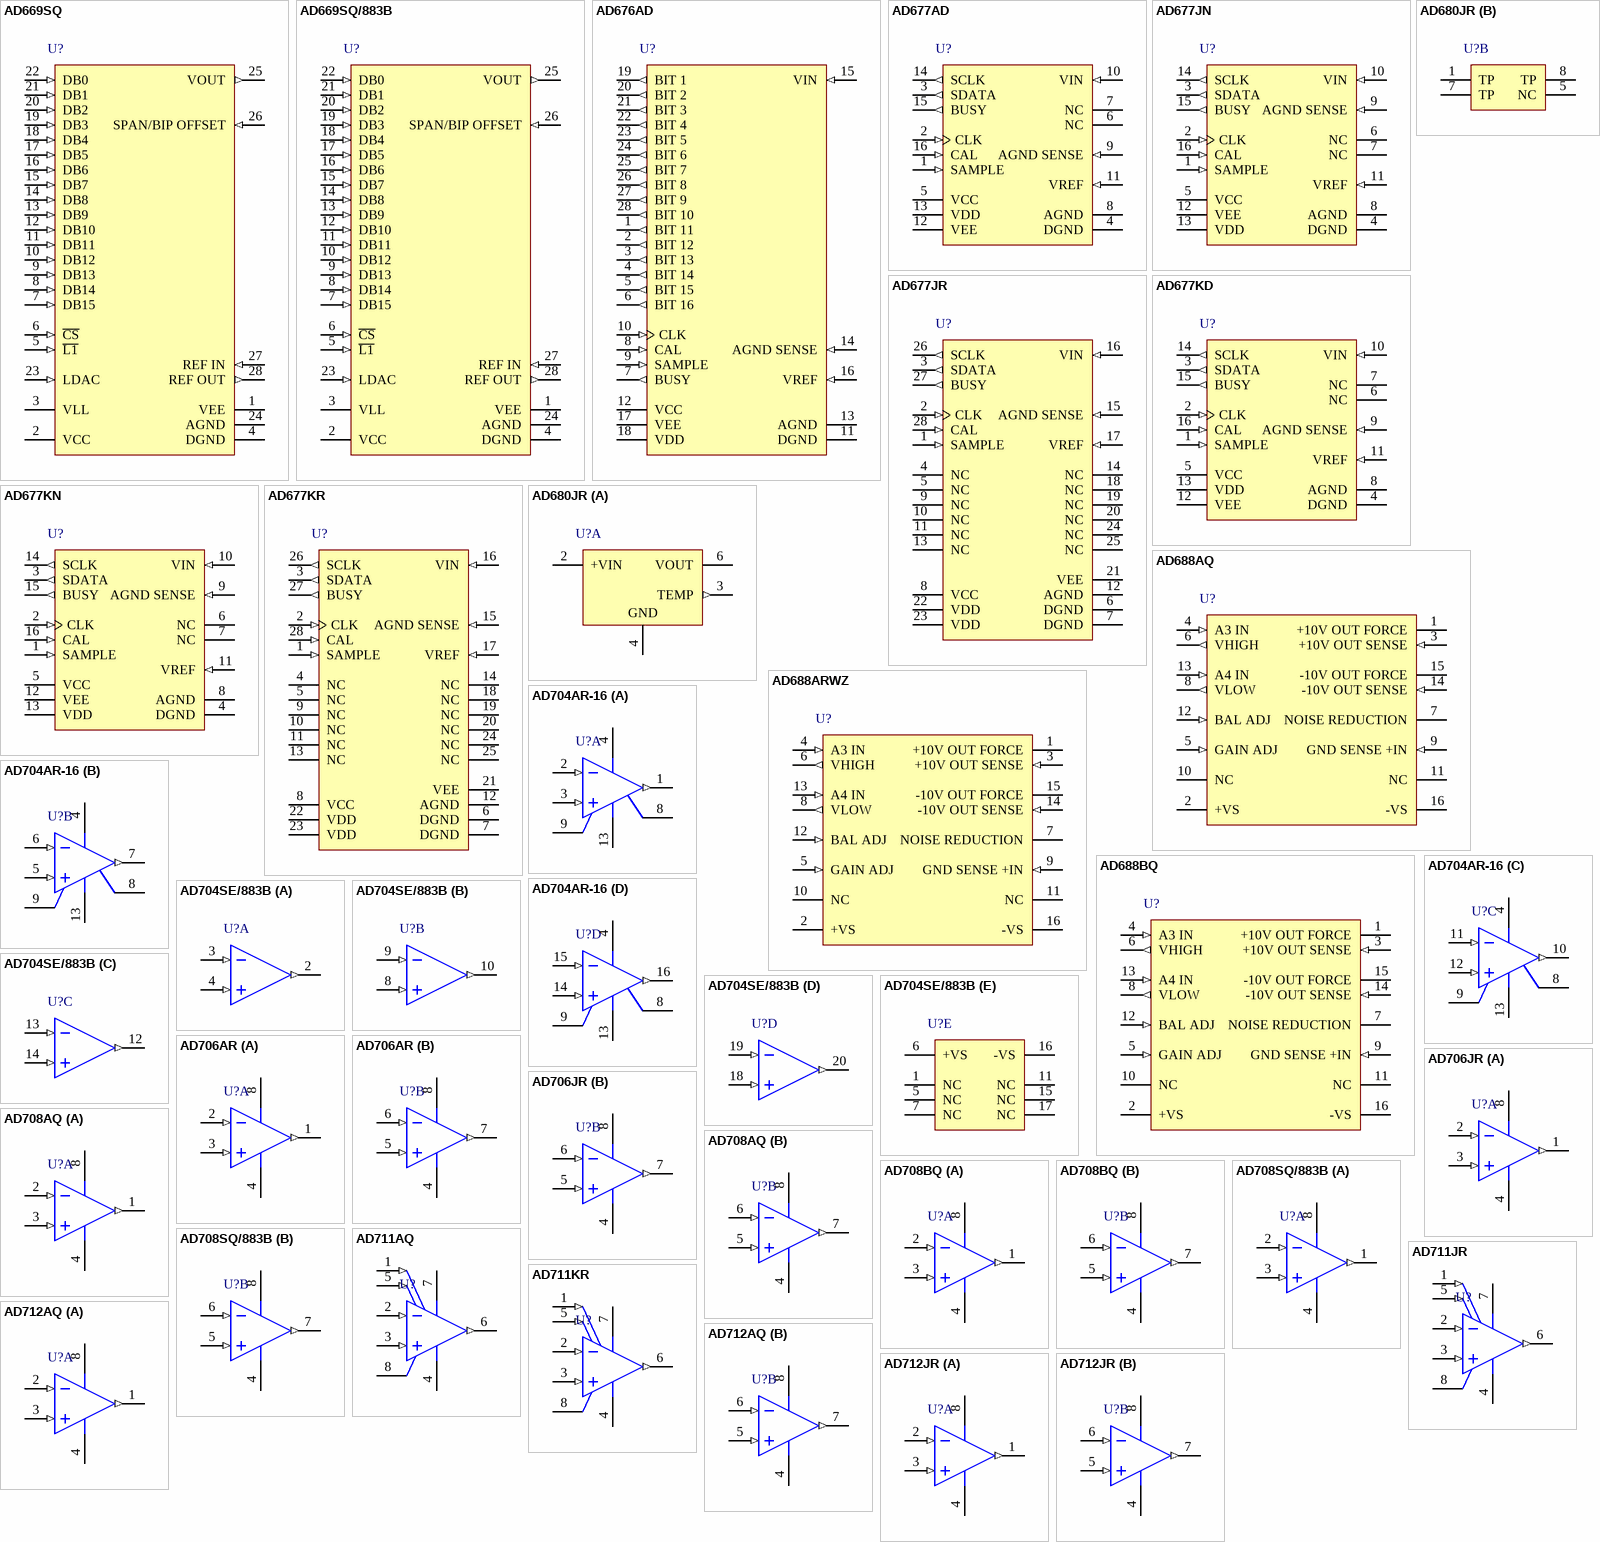
[diagram p4: symbols AD669SQ to AD712JR]

## AD669SQ
designator U?
Single 16-Bit Monolithic DACPORT, -55 to +125 degC, Q-28-2, Tube; Generic Part Number: AD669; PartNumber: AD669SQ; # DAC Outputs: 1; Max V+: 16.5V; Op Pwr Diss: 625mW; Resolution (Bits): 16; Settling Time: 6祍; Single Supply: No; DatasheetVersion: Rev.A; PackageVersion: 030106-A; PackageReference: Q-28-2; PackageDescription: 28-Lead Ceramic Dual In-Line Package [CERDIP]; Supplier Part Number 1: AD669SQ-ND; Supplier Part Number 2: 09B5478; Supplier Part Number 3: 584-AD669SQ; Packing: Tube; RoHS: N; Mounting Technology: Through Hole; ComponentLink1Description: Manufacturer URL; ComponentLink2Description: Datasheet; ComponentLink3Description: Package Specification; ComponentLink4Description: Product URL
footprint DIP28W (Footprint not found)
pins: 1 VEE (power), 2 VCC (power), 3 VLL (power), 4 DGND (power), 5 ~{L1} (in), 6 ~{CS} (in), 7 DB15 (in), 8 DB14 (in), 9 DB13 (in), 10 DB12 (in), 11 DB11 (in), 12 DB10 (in), 13 DB9 (in), 14 DB8 (in), 15 DB7 (in), 16 DB6 (in), 17 DB5 (in), 18 DB4 (in), 19 DB3 (in), 20 DB2 (in), 21 DB1 (in), 22 DB0 (in), 23 LDAC (in), 24 AGND (power), 25 VOUT (out), 26 SPAN/BIP OFFSET (in), 27 REF IN (in), 28 REF OUT (out)

## AD669SQ/883B
designator U?
Single 16-Bit Monolithic DACPORT, -55 to +125 degC, Q-28-2, Tube; Generic Part Number: AD669; PartNumber: AD669SQ/883B; # DAC Outputs: 1; Max V+: 16.5V; Op Pwr Diss: 625mW; Resolution (Bits): 16; Settling Time: 6祍; Single Supply: No; DatasheetVersion: Rev.A; PackageVersion: 030106-A; PackageReference: Q-28-2; PackageDescription: 28-Lead Ceramic Dual In-Line Package [CERDIP]; Supplier Part Number 1: 584-AD669SQ883B; Packing: Tube; RoHS: N; Mounting Technology: Through Hole; ComponentLink1Description: Manufacturer URL; ComponentLink2Description: Datasheet; ComponentLink3Description: Package Specification; ComponentLink4Description: Product URL
footprint DIP28W (Footprint not found)
pins: 1 VEE (power), 2 VCC (power), 3 VLL (power), 4 DGND (power), 5 ~{L1} (in), 6 ~{CS} (in), 7 DB15 (in), 8 DB14 (in), 9 DB13 (in), 10 DB12 (in), 11 DB11 (in), 12 DB10 (in), 13 DB9 (in), 14 DB8 (in), 15 DB7 (in), 16 DB6 (in), 17 DB5 (in), 18 DB4 (in), 19 DB3 (in), 20 DB2 (in), 21 DB1 (in), 22 DB0 (in), 23 LDAC (in), 24 AGND (power), 25 VOUT (out), 26 SPAN/BIP OFFSET (in), 27 REF IN (in), 28 REF OUT (out)

## AD676AD
designator U?
Single 16-Bit Sampling Analog-to-Digital Converter with Parallel Interface, 100KSPS, -40 to +85 degC, D-28, Tube; Generic Part Number: AD676; PartNumber: AD676AD; Resolution (Bits): 16; Channels: 1; Throughput Rate (SPS): 100K; Interface: Par; DatasheetVersion: Rev.A; PackageVersion: 2003; PackageReference: D-28; PackageDescription: 28-Lead Side-Brazed Ceramic Dual In-Line Package [SBDIP]; Supplier Part Number 1: AD676AD-ND; Supplier Part Number 2: 05F7197; Supplier Part Number 3: 584-AD676AD; RoHS: N; Packing: Tube; Mounting Technology: Through-hole; ComponentLink1Description: Manufacturer URL; ComponentLink2Description: Datasheet; ComponentLink3Description: Package Specification; ComponentLink4Description: Product URL
footprint DIP28W (Footprint not found)
pins: 1 BIT 11 (out) "BIT 11 represent the six LSBs of data.", 2 BIT 12 (out) "BIT 12 represent the six LSBs of data.", 3 BIT 13 (out) "BIT 13 represent the six LSBs of data.", 4 BIT 14 (out) "BIT 14 represent the six LSBs of data.", 5 BIT 15 (out) "BIT 15 represent the six LSBs of data.", 6 BIT 16 (out) "BIT 16 represent the six LSBs of data.", 7 BUSY (out) "Status Line for Converter. Active HIGH, indicating a conversion or calibration in progress. BUSY should be buffered when capacitively loaded.", 8 CAL (in) "Calibration Control Pin (Asynchronous).", 9 SAMPLE (in) "VIN Acquisition Control Pin. Active HIGH. During conversion, SAMPLE controls the state of the internal sample-hold amplifier and the falling edge initiates conversion (see "Conversion Control" paragraph). During calibration, (See Datasheet)", 10 CLK (in) "Master Clock Input. The AD676 requires 17 clock cycles to execute a conversion.", 11 DGND (power) "Digital Ground.", 12 VCC (power) "+12 V Analog Supply Voltage", 13 AGND (power) "Analog Ground.", 14 AGND SENSE (in) "Analog Ground Sense.", 15 VIN (in) "Analog Input Voltage.", 16 VREF (in) "External Voltage Reference Input.", 17 VEE (power) "-12 V Analog Supply Voltage. Note: the lid of the ceramic package is internally connected to VEE.", 18 VDD (power) "+5 V Logic Supply Voltage.", 19 BIT 1 (out) "BIT 1 represent the ten MSB of data.", 20 BIT 2 (out) "BIT 2 represent the ten MSB of data.", 21 BIT 3 (out) "BIT 3  represent the ten MSB of data.", 22 BIT 4 (out) "BIT 4 represent the ten MSB of data.", 23 BIT 5 (out) "BIT 5 represent the ten MSB of data.", 24 BIT 6 (out) "BIT 6 represent the ten MSB of data.", 25 BIT 7 (out) "BIT 7 represent the ten MSB of data.", 26 BIT 8 (out) "BIT 8 represent the ten MSB of data.", 27 BIT 9 (out) "BIT 9 represent the ten MSB of data.", 28 BIT 10 (out) "BIT 10 represent the ten MSB of data."

## AD677AD
designator U?
Single 16-Bit Sampling Analog-to-Digital Converter with Serial Interface, 100KSPS, -40 to +85 degC, D-16, Tube; Generic Part Number: AD677; PartNumber: AD677AD; Resolution (Bits): 16; Channels: 1; Throughput Rate (SPS): 100K; Interface: Ser; DatasheetVersion: Rev.A; PackageVersion: Oct-2004; PackageReference: D-16; PackageDescription: 16-Lead Side-Brazed Ceramic Dual In-Line Package [SBDIP]; Supplier Part Number 1: AD677AD-ND; Supplier Part Number 2: 05F7201; Supplier Part Number 3: 584-AD677AD; RoHS: N; Packing: Tube; Mounting Technology: Through-hole; ComponentLink1Description: Manufacturer URL; ComponentLink2Description: Datasheet; ComponentLink3Description: Package Specification; ComponentLink4Description: Product URL
footprint DIP16 (Footprint not found)
pins: 1 SAMPLE (in) "VIN Acquisition Control Pin. Active HIGH. During conversion, SAMPLE controls the suite of the internal sample-hold amplifier and the falling edge initiates conversion. During calibration, SAMPLE should be held LOW. If HIGH (See Datasheet)", 2 CLK (in) "Master Clock Input. The AD677 requires 17 clock pulses to execute a conversion. CLK is also used to derive SCLK.", 3 SDATA (out) "Serial Output Data Controlled by SCLK.", 4 DGND (power) "Digital Ground.", 5 VCC (power) "+12 V Analog Supply Voltage.", 6 NC "No Connection. No connections should be made to these pins.", 7 NC "No Connection. No connections should be made to these pins.", 8 AGND (power) "Analog Ground.", 9 AGND SENSE (in) "Analog Ground Sense.", 10 VIN (in) "Analog Input Voltage.", 11 VREF (in) "External Voltage Reference Input.", 12 VEE (power) "-12 V Analog Supply Voltage.", 13 VDD (power) "+5 V Logic Supply Voltage.", 14 SCLK (out) "Clock Output for Data Read, derived from CLK.", 15 BUSY (out) "Status Line for Converter. Active HIGH, indicating a conversion or calibration in progress.", 16 CAL (in) "Calibration Control Pin."

## AD677JN
designator U?
Single 16-Bit Sampling Analog-to-Digital Converter with Serial Interface, 100KSPS, 0 to +70 degC, N-16, Tube; Generic Part Number: AD677; PartNumber: AD677JN; Resolution (Bits): 16; Channels: 1; Throughput Rate (SPS): 100K; Interface: Ser; DatasheetVersion: Rev.A; PackageVersion: 070706-A; PackageReference: N-16; PackageDescription: 16-Lead Plastic Dual In-Line Package [PDIP] Narrow Body; Supplier Part Number 1: AD677JN-ND; Supplier Part Number 2: 584-AD677JN; RoHS: N; Packing: Tube; Mounting Technology: Through-hole; Code_JEDEC: MS-001; ComponentLink1Description: Manufacturer URL; ComponentLink2Description: Datasheet; ComponentLink3Description: Package Specification; ComponentLink4Description: Product URL
footprint DIP16 (Footprint not found)
pins: 1 SAMPLE (in) "VIN  Acquisition Control Pin. Active HIGH. During conversion, SAMPLE controls the suite of the internal sample-hold amplifier and the falling edge initiates conversion. During calibration, SAMPLE should be held LOW. If HIGH (See Datasheet)", 2 CLK (in) "Master Clock Input. The AD677 requires 17 clock pulses to execute a conversion. CLK is also used to derive SCLK.", 3 SDATA (out) "Serial Output Data Controlled by SCLK.", 4 DGND (power) "Digital Ground.", 5 VCC (power) "+12 V Analog Supply Voltage.", 6 NC "No Connection. No connections should be made to these pins.", 7 NC "No Connection. No connections should be made to these pins.", 8 AGND (power) "Analog Ground.", 9 AGND SENSE (in) "Analog Ground Sense.", 10 VIN (in) "Analog Input Voltage.", 11 VREF (in) "External Voltage Reference Input.", 12 VEE (power) "-12 V Analog Supply Voltage.", 13 VDD (power) "+5 V Logic Supply Voltage.", 14 SCLK (out) "Clock Output for Data Read, derived from CLK.", 15 BUSY (out) "Status Line for Converter. Active HIGH, indicating a conversion or calibration in progress.", 16 CAL (in) "Calibration Control Pin."